# Altium footprint library PcbLib1.PcbLib: 9 footprints
Each footprint in its own frame and in the unit in brackets; x right, y up, seen from the top. Pads: shape width x height; smd on the part's side, far side on the other; paste and mask are expansions set on the pad; w line width, h text height; cw(c..) or ccw(c..) is an arc to the next point about the centre after c.
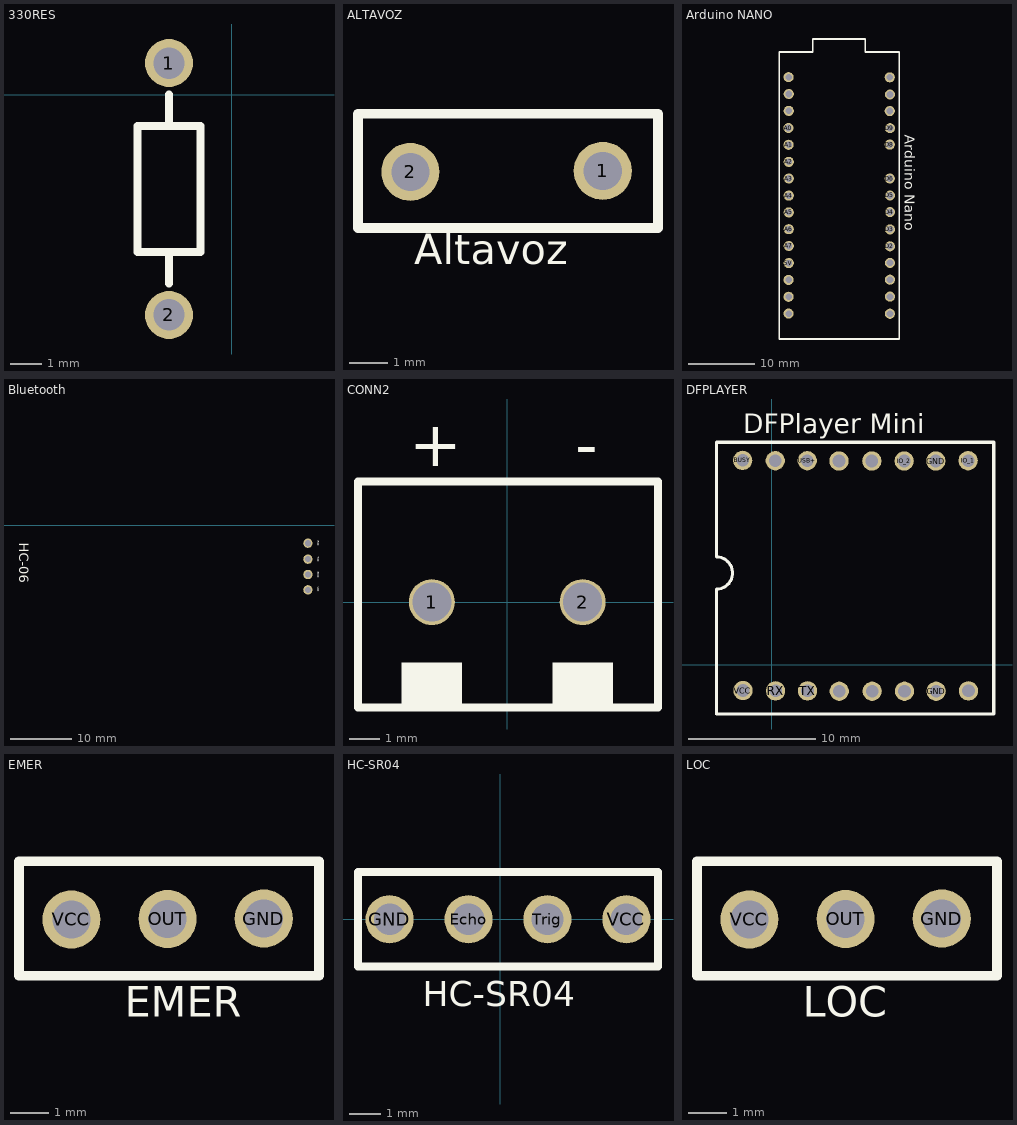
[diagram p0: the footprints below, top view; thin cyan lines are the x and y axes]

## 330RES [mm]
pads (2):
  round 1.524 hole 1: 1(-2,1) 2(-2,-7)
Top Overlay:
  lines w0.254: -2,-6 -2,-5 ; -2,-1 -2,0 ; -3,-5 -3,-1 -1.5,-1 -1,-1 -1,-5 -3,-5
3D body "R330_L8mm_0.25watts.STEP": height 2.64, standoff -2.62, extent -3.26,-7.25 -0.74,1.25

## ALTAVOZ [mm]
pads (2):
  round 1.524 hole 1: 1(-240.45,-53.275) 2(-245.5,-53.3)
Top Overlay:
  lines w0.254: -246.875,-54.775 -246.875,-51.775 -239,-51.775 -239,-54.775 -246.875,-54.775
  text "Altavoz" at -245.4,-55.725 h0.8
3D body "User Library-1x3 TH Pitch 2_54mm.STEP": height 9.2, standoff -3.5, extent -246.745,-54.57 -239.125,-52.03

## Arduino NANO [mm]
pads (29):
  round 1.524 hole 1: 3V3(-257.6,538.875) 5V(-257.6,513.425) A0(-257.65,533.75) A1(-257.625,531.225) A2(-257.6,528.65) A3(-257.6,526.15) A4(-257.6,523.575) A5(-257.6,521.05) A6(-257.6,518.525) A7(-257.6,516) D2(-242.375,515.95) D3(-242.375,518.5) D4(-242.375,521.1) D5(-242.375,523.6) D6(-242.4,526.15) D8(-242.4,531.25) D9(-242.375,533.725) D10(-242.4,536.3) D11(-242.375,538.8) D12(-242.4,541.375) D13(-257.625,541.4) GND(-257.625,508.35) GND(-242.375,513.45) REF(-257.6,536.325) RST(-257.625,510.9) RST(-242.375,510.925) RXD(-242.375,508.375) TX1(-242.375,505.8) VIN(-257.625,505.825)
Top Overlay:
  lines w0.254: -254.519,545.2 -259.025,545.2 ; -246.1,545.2 -241,545.2 -240.975,545.175 -240.975,544.4 -240.975,502 -259.025,502 -259.025,545.2 ; -246.1,545.263 -246.1,545.706 -246.1,546.594 -246.1,547.1 ; -246.1,547.144 -252.405,547.144 -253.452,547.144 -253.975,547.144 -253.975,545.2 -259.025,545.2
  text "Arduino Nano" at -240.171,532.771 h1.52
3D body "User Library-ARDUINO_NANO_V3.STEP": height 12.4, standoff -6.2, extent -259,502 -241,547

## Bluetooth [mm]
pads (4):
  round 1.524 hole 1: GND(-12.8,-8) RXD(-12.8,-2.9) TXD(-12.8,-5.5) VCC(-12.8,-10.5)
Top Overlay:
  text "RXD" at -11.29,-2.476 h0.3
  text "TXD" at -11.29,-5.107 h0.3
  text "GND" at -11.29,-7.544 h0.3
  text "VCC" at -11.29,-10.03 h0.3
  text "HC-06" at -59.878,-2.836 h1.52
3D body "SSQ-104-02-S-S-RA.stp": height 5.71, standoff 0.75, extent -22.751,-11.968 -12.4,-1.3
3D body "User Library-blue.STEP": height 5.05, standoff 0.25, extent -58.1,-14.6 -18.681,1.4
3D body "SL-104-T-32.stp": height 2.48, standoff -2.34, extent -14.04,-11.8 -11.5,-1.64

## CONN2 [mil]
pads (2):
  round 60 hole 51.18: 1(-98.43,0) 2(98.43,0)
Top Overlay:
  rectangle: -137.8,-137.8 -59.06,-78.74
  rectangle: 59.06,-137.8 137.8,-78.74
  lines w10: 88.58,-137.8 157.48,-137.8 ; 88.58,-137.8 19.68,-137.8 -118.11,-137.8 -157.48,-137.8 -194.88,-137.8 -194.88,157.48 196.85,157.48 196.85,-137.8 157.48,-137.8 ; 88.58,-137.8 157.48,-137.8
  text "+" at -127.8,177.17 h60
  text "-" at 88.74,176.86 h60
3D body "Connector.STEP": height 401.57, standoff -120.08, extent -196.85,-137.8 196.85,157.48

## DFPLAYER [mm]
pads (16):
  round 1.524 hole 1: ADKEY_1(7.9,16.075) ADKEY_2(5.3,16.075) BUSY(-2.3,16.125) DAC_I(7.925,-2.1) DAC_R(5.325,-2.1) GND(12.95,16.075) GND(12.975,-2.1) IO_1(15.5,16.1) IO_2(10.45,16.075) RX(0.3,-2.075) SPK_1(10.475,-2.1) SPK_2(15.525,-2.075) TX(2.825,-2.075) "USB -"(0.275,16.1) USB+(2.8,16.1) VCC(-2.275,-2.05)
Top Overlay:
  lines w0.254: -4.375,-3.9 -4.375,-3.9 ; -4.375,-3.9 -4.375,5.956 ccw(c-4.375,7.231) -4.375,8.506 -4.375,17.55 17.525,17.55 17.525,-3.9 -4.375,-3.9 ; -4.375,-3.9 -4.375,-3.9
  text "DFPlayer Mini" at -2.246,18.262 h1.52
3D body "User Library-MP3-TF-16P.STEP": height 5.67, standoff -5.87, extent -4.371,-3.9 17.571,17.61

## EMER [mm]
pads (3):
  round 1.524 hole 1: GND(-420.075,226) OUT(-422.6,225.988) VCC(-425.125,225.975)
Top Overlay:
  lines w0.254: -426.5,224.5 -426.5,227.5 -418.625,227.5 -418.625,224.5 -426.5,224.5
  text "EMER" at -423.725,223.425 h0.8
3D body "User Library-1x3 TH Pitch 2_54mm.STEP": height 9.2, standoff -3.5, extent -426.37,224.705 -418.75,227.245

## HC-SR04 [mil]
pads (4):
  round 60 hole 39.37: Echo(-39.37,0) GND(-137.8,0) Trig(59.06,0) VCC(157.48,0)
Top Overlay:
  region: -177.17,-59.06
  lines w10: -177.17,-59.06 196.85,-59.06 196.85,59.06 -177.17,59.06 -177.17,-59.06
  text "HC-SR04" at -96.46,-108.27 h31.5
3D body "User Library-Pin Header Strip.STEP": height 335, standoff -145, extent -187.8,-57.48 12.2,57.48
3D body "User Library-Pin Header Strip.STEP": height 335, standoff -145, extent 9.06,-57.48 209.06,57.48

## LOC [mm]
pads (3):
  round 1.524 hole 1: GND(-230.825,-86.25) OUT(-233.35,-86.262) VCC(-235.875,-86.275)
Top Overlay:
  lines w0.254: -237.25,-87.75 -229.375,-87.75 -229.375,-84.75 -237.25,-84.75 -237.25,-87.75
  text "LOC" at -234.475,-88.825 h0.8
3D body "User Library-1x3 TH Pitch 2_54mm.STEP": height 9.2, standoff -3.5, extent -237.12,-87.545 -229.5,-85.005